# Altium footprint library User.PcbLib: 317 footprints (part 3 of 20)
Each footprint in its own frame and in the unit in brackets; x right, y up, seen from the top. Pads: shape width x height; smd on the part's side, far side on the other; paste and mask are expansions set on the pad; w line width, h text height; cw(c..) or ccw(c..) is an arc to the next point about the centre after c.
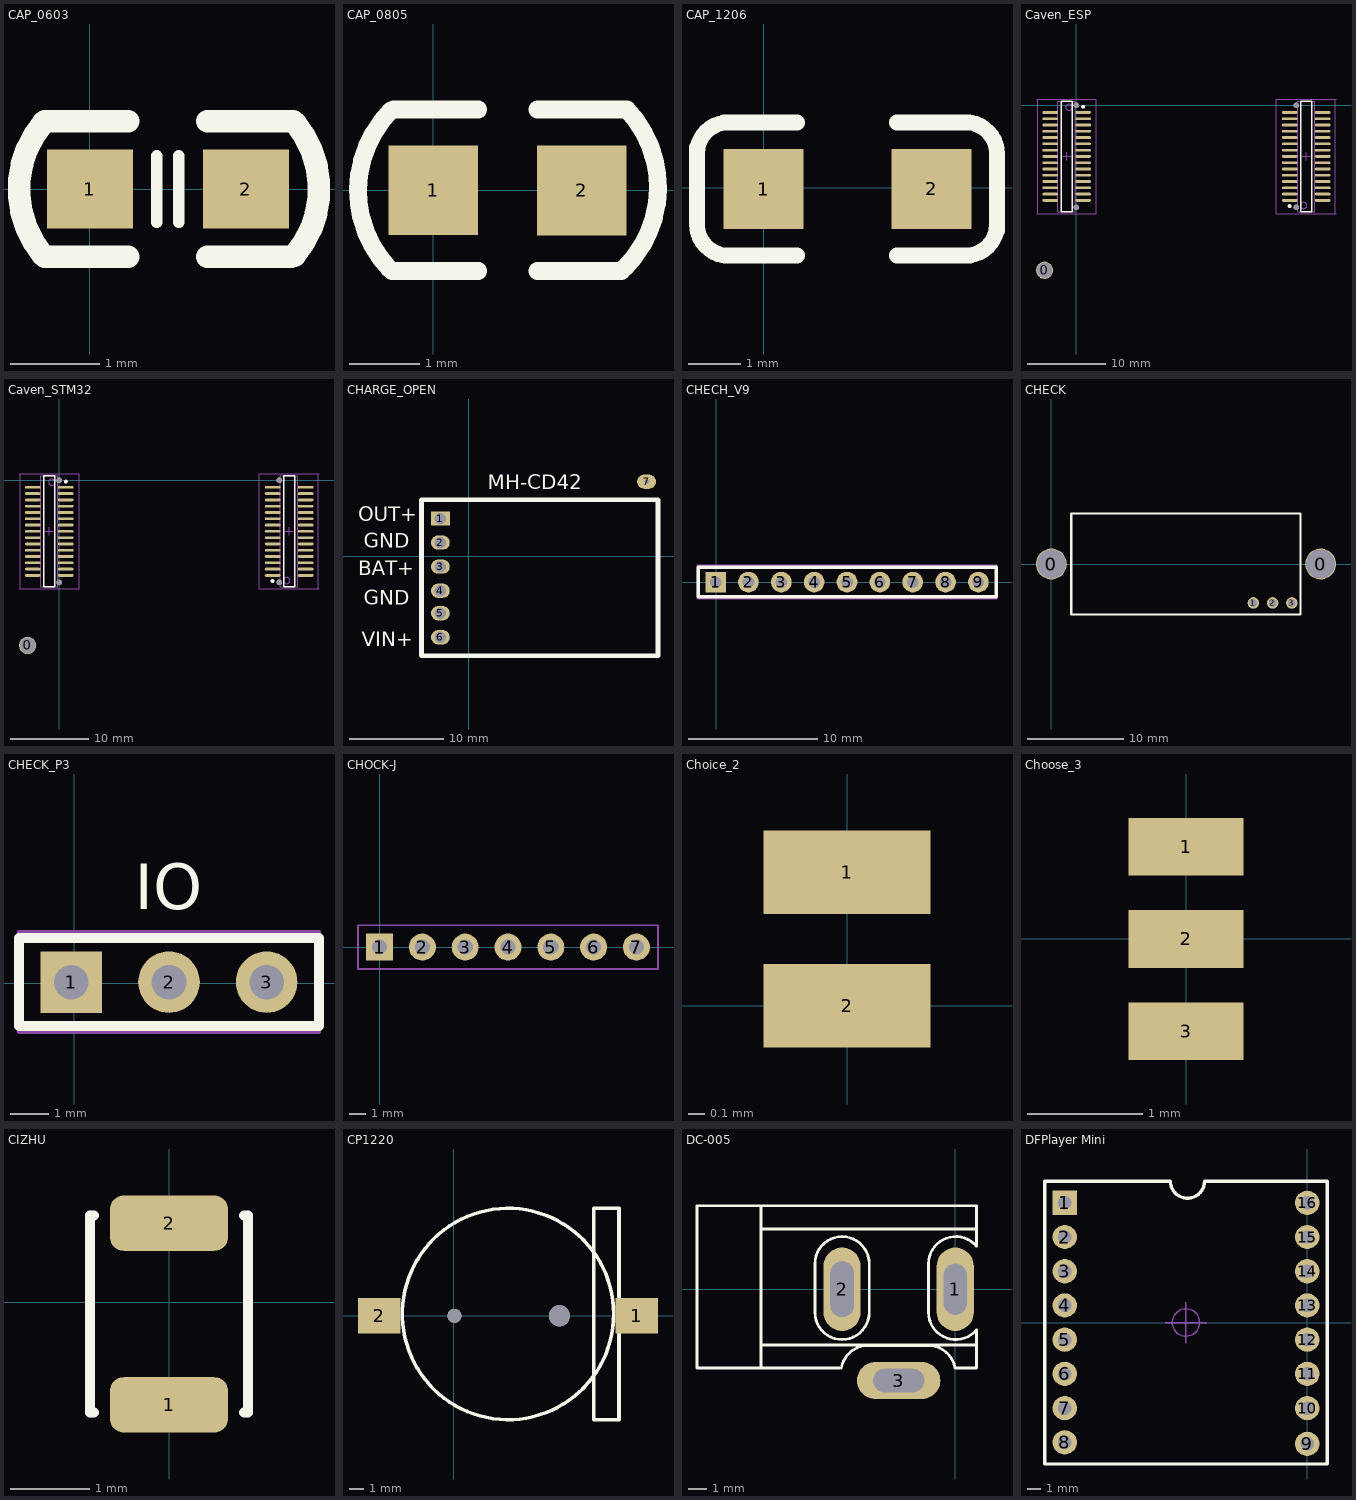
[diagram p2: the footprints below, top view; thin cyan lines are the x and y axes]

## CAP_0603 [mil]
pads (2):
  rect 38x35 smd: 1(0,0) 2(69,0)
Top Overlay:
  lines w5: 29.53,-14.83 29.53,14.7 ; 39.37,-14.83 39.37,14.7
  lines w10: -21,-29 cw(c14.45,-0.04) -20.48,29.56 ; -20,-30 17,-30 ; -20,30 17,30 ; 52,-30 89,-30 ; 52,30 90,30 ; 90.48,-29.56 ccw(c55.55,0.04) 91,29
3D body "User Library-0603 SMD Capacitor.STEP": height 11.89, standoff 0, extent 3.8,-15.8 66.8,15.7

## CAP_0805 [mm]
pads (2):
  rect 1.27x1.27 smd: 1(0,0) 2(2.101,-0.003)
Top Overlay:
  lines w0.254: -0.626,-1.109 cw(c0.539,-0.002) -0.602,1.13 ; -0.589,-1.143 0.635,-1.143 ; -0.566,1.143 0.635,1.143 ; 1.473,-1.143 2.667,-1.143 ; 1.473,1.143 2.72,1.143 ; 2.716,-1.093 ccw(c1.574,0.039) 2.743,1.143
3D body "User Library-0805 SMD Capacitor.STEP": height 0.77, standoff -0.01, extent 0.049,-0.622 2.049,0.628

## CAP_1206 [mil]
pads (2):
  rect 60x60 smd: 1(0,-1) 2(126,-1)
Top Overlay:
  lines w11.81: -50,-27 ccw(c-26.5,-27.5) -27,-51 ; -50,26 cw(c-26.5,25.5) -26,49 ; 151,-51 ccw(c151.5,-27.5) 175,-28 ; 152,49 cw(c151.5,25.5) 175,25
  lines w12: -50,-28 -50,30 ; -29,-51 25,-51 ; -28,49 25,49 ; 100,-51 153,-51 ; 100,49 154,49 ; 175,-32 175,26
3D body "Capacitor 1206 SMD1.step": height 39.45, standoff 0, extent 0.01,-32.49 126,30.5

## Caven_ESP [mm] "Caven_ESP"
pads (65):
  round 2.2 hole 2: 0(-4.051,-21)
  round 0.7 hole 0.7: 0(0,-13) 0(0,0) 0(28,-13) 0(28,0)
  oval 2x0.35 smd: 1(-3.35,-0.9) 2(-3.35,-1.7) 3(-3.35,-2.5) 4(-3.35,-3.3) 5(-3.35,-4.1) 6(-3.35,-4.9) 7(-3.35,-5.7) 8(-3.35,-6.5) 9(-3.35,-7.3) 10(-3.35,-8.1) 11(-3.35,-8.9) 12(-3.35,-9.7) 13(-3.35,-10.5) 14(-3.35,-11.3) 15(-3.35,-12.1) 16(0.85,-12.1) 17(0.85,-11.3) 18(0.85,-10.5) 19(0.85,-9.7) 20(0.85,-8.9) 21(0.85,-8.1) 22(0.85,-7.3) 23(0.85,-6.5) 24(0.85,-5.7) 25(0.85,-4.9) 26(0.85,-4.1) 27(0.85,-3.3) 28(0.85,-2.5) 29(0.85,-1.7) 30(0.85,-0.9) 31(27.15,-0.9) 32(27.15,-1.7) 33(27.15,-2.5) 34(27.15,-3.3) 35(27.15,-4.1) 36(27.15,-4.9) 37(27.15,-5.7) 38(27.15,-6.5) 39(27.15,-7.3) 40(27.15,-8.1) 41(27.15,-8.9) 42(27.15,-9.7) 43(27.15,-10.5) 44(27.15,-11.3) 45(27.15,-12.1) 46(31.35,-12.1) 47(31.35,-11.3) 48(31.35,-10.5) 49(31.35,-9.7) 50(31.35,-8.9) 51(31.35,-8.1) 52(31.35,-7.3) 53(31.35,-6.5) 54(31.35,-5.7) 55(31.35,-4.9) 56(31.35,-4.1) 57(31.35,-3.3) 58(31.35,-2.5) 59(31.35,-1.7) 60(31.35,-0.9)
Top Overlay:
  circle w0.25: c0.85,-0.175 r0.125
  circle w0.25: c27.15,-12.825 r0.125
  lines w0.2: -1.95,-13.55 -0.55,-13.55 -0.55,0.55 -1.95,0.55 -1.95,-13.55 ; 28.55,-13.55 28.55,0.55 29.95,0.55 29.95,-13.55 28.55,-13.55
Mechanical 13:
  circle w0.1: c-0.95,-0.25 r0.4
  circle w0.1: c28.95,-12.75 r0.4
  lines w0.1: -2.35,-13.55 -0.15,-13.55 -0.15,0.55 -2.35,0.55 -2.35,-13.55 ; 28.15,-13.55 28.15,0.55 30.35,0.55 30.35,-13.55 28.15,-13.55
Mechanical 15:
  lines w0.05: -5.05,-13.8 2.55,-13.8 2.55,0.8 -5.05,0.8 ; -4.95,-13.8 -4.95,0.8 ; 32.95,-13.8 32.95,0.8 ; 33.05,-13.8 25.45,-13.8 25.45,0.8 33.05,0.8
  lines w0.1: -1.75,-6.5 -0.75,-6.5 ; -1.25,-7 -1.25,-6 ; 28.75,-6.5 29.75,-6.5 ; 29.25,-7 29.25,-6
3D body "SG340-GxxS-B1-2x15.STEP": height 4, standoff -0.6, extent 26.75,-13.45 31.75,0.45
3D body "SG340-GxxS-B1-2x15.STEP": height 4, standoff -0.6, extent 26.75,-13.45 31.75,0.45
3D body "SG340-GxxS-B1-2x15.STEP": height 4, standoff -0.6, extent -3.75,-13.45 1.25,0.45
3D body "PCB.step": height 11.85, standoff 2.29, extent -6.02,-23.012 34.081,19.134

## Caven_STM32 [mm]
pads (65):
  round 2.2 hole 2: 0(-4,-21)
  round 0.7 hole 0.7: 0(0,-13) 0(0,0) 0(28,-13) 0(28,0)
  oval 2x0.35 smd: 1(-3.35,-0.9) 2(-3.35,-1.7) 3(-3.35,-2.5) 4(-3.35,-3.3) 5(-3.35,-4.1) 6(-3.35,-4.9) 7(-3.35,-5.7) 8(-3.35,-6.5) 9(-3.35,-7.3) 10(-3.35,-8.1) 11(-3.35,-8.9) 12(-3.35,-9.7) 13(-3.35,-10.5) 14(-3.35,-11.3) 15(-3.35,-12.1) 16(0.85,-12.1) 17(0.85,-11.3) 18(0.85,-10.5) 19(0.85,-9.7) 20(0.85,-8.9) 21(0.85,-8.1) 22(0.85,-7.3) 23(0.85,-6.5) 24(0.85,-5.7) 25(0.85,-4.9) 26(0.85,-4.1) 27(0.85,-3.3) 28(0.85,-2.5) 29(0.85,-1.7) 30(0.85,-0.9) 31(27.15,-0.9) 32(27.15,-1.7) 33(27.15,-2.5) 34(27.15,-3.3) 35(27.15,-4.1) 36(27.15,-4.9) 37(27.15,-5.7) 38(27.15,-6.5) 39(27.15,-7.3) 40(27.15,-8.1) 41(27.15,-8.9) 42(27.15,-9.7) 43(27.15,-10.5) 44(27.15,-11.3) 45(27.15,-12.1) 46(31.35,-12.1) 47(31.35,-11.3) 48(31.35,-10.5) 49(31.35,-9.7) 50(31.35,-8.9) 51(31.35,-8.1) 52(31.35,-7.3) 53(31.35,-6.5) 54(31.35,-5.7) 55(31.35,-4.9) 56(31.35,-4.1) 57(31.35,-3.3) 58(31.35,-2.5) 59(31.35,-1.7) 60(31.35,-0.9)
Top Overlay:
  circle w0.25: c27.15,-12.825 r0.125
  circle w0.25: c0.85,-0.175 r0.125
  lines w0.2: -1.95,-13.55 -1.95,0.55 -0.55,0.55 -0.55,-13.55 -1.95,-13.55 ; 28.55,-13.55 29.95,-13.55 29.95,0.55 28.55,0.55 28.55,-13.55
Mechanical 13:
  circle w0.1: c28.95,-12.75 r0.4
  circle w0.1: c-0.95,-0.25 r0.4
  lines w0.1: -2.35,-13.55 -2.35,0.55 -0.15,0.55 -0.15,-13.55 -2.35,-13.55 ; 28.15,-13.55 30.35,-13.55 30.35,0.55 28.15,0.55 28.15,-13.55
Mechanical 15:
  lines w0.05: -5.05,-13.8 2.55,-13.8 2.55,0.8 -5.05,0.8 ; -4.95,-13.8 -4.95,0.8 ; 32.95,-13.8 32.95,0.8 ; 33.05,-13.8 25.45,-13.8 25.45,0.8 33.05,0.8
  lines w0.1: -1.75,-6.5 -0.75,-6.5 ; -1.25,-7 -1.25,-6 ; 28.75,-6.5 29.75,-6.5 ; 29.25,-7 29.25,-6
3D body "SG340-GxxS-B1-2x15.STEP": height 4, standoff -0.6, extent -3.75,-13.45 1.25,0.45
3D body "SG340-GxxS-B1-2x15.STEP": height 4, standoff -0.6, extent 26.74,-13.454 31.74,0.446
3D body "Cavend.step": height 11.19, standoff 2.14, extent -6,-23 34.254,16.523

## CHARGE_OPEN [mm]
pads (7):
  rect 2x1.5 hole 1.2: 1(-3,4)
  oval 2x1.5 hole 1.2: 2(-3,1.46) 3(-3,-1.08) 4(-3,-3.62) 5(-3,-6) 6(-3,-8.54)
  oval 2x1.5 hole 0.5: 7(18.8,7.9)
Top Overlay:
  lines w0.5: -5,-10.5 -5,6 20,6 20,-10.5 -5,-10.5
  text "OUT+" at -11.7,3.7 h1.52
  text "VIN+" at -11.3,-9.5 h1.52
  text "GND" at -11.1,-5.1 h1.52
  text "GND" at -11.1,0.9 h1.52
  text "BAT+" at -11.7,-2 h1.52
  text "MH-CD42" at 2,7.1 h1.52
3D body: height 5, standoff 0.2, extent -5,-10.5 20,6

## CHECH_V9 [mm]
pads (9):
  rect 1.6x1.6 hole 0.9: 1(-0.05,0)
  round 1.6 hole 0.9: 2(2.49,0) 3(5.03,0) 4(7.57,0) 5(10.11,0) 6(12.65,0) 7(15.19,0) 8(17.73,0) 9(20.27,0)
Top Overlay:
  lines w0.254: -1.39,-1.143 21.65,-1.143 21.65,1.143 -1.39,1.143 -1.39,-1.143
Mechanical 15:
  lines w0.1: -1.49,-1.3 21.71,-1.3 21.71,1.3 -1.49,1.3 -1.49,-1.3
3D body "Header-F-2.54X9.stp": height 8.6, standoff -3.1, extent -1.445,-1.26 21.665,1.24

## CHECK [mm] "VEL-CHECK"
pads (5):
  round 3.2 hole 3: 0(0,0) 0(28,0)
  round 1.2 hole 0.8: 1(21.008,-4.05) 2(23.008,-4.05) 3(25.008,-4.05)
Top Overlay:
  lines w0.254: 2.083,-5.25 25.908,-5.25 25.908,5.25 2.083,5.25 2.083,-5.25
3D body "M3x9.STEP": height 9.05, standoff 0.05, extent 25.302,-2.35 30.698,2.35
3D body "M3x9.STEP": height 9.05, standoff 0.05, extent -2.698,-2.35 2.698,2.35
3D body "SMG 0.28-3P.STEP": height 18, standoff 8.4, extent 2.731,-5.051 25.261,4.949
3D body "HDR2.0-LI-3P.STEP": height 1.5, standoff -7.8, extent 20.008,-5.05 26.008,-3.05

## CHECK_P3 [mm]
pads (3):
  rect 1.6x1.6 hole 0.9: 1(-0.076,0.025)
  round 1.6 hole 0.9: 2(2.464,0.025) 3(5.004,0.025)
Top Overlay:
  lines w0.254: -1.436,-1.118 -1.436,1.168 6.364,1.168 6.364,-1.118 -1.436,-1.118
  text "IO" at 1.577,1.534 h2.03
Mechanical 15:
  lines w0.1: -1.436,-1.275 -1.436,1.325 6.364,1.325 6.364,-1.275 -1.436,-1.275
3D body "Header-F-2.54X3.stp": height 8.6, standoff -3.1, extent -1.471,-1.235 6.399,1.265

## CHOCK-J [mm]
pads (7):
  rect 1.6x1.6 hole 0.9: 1(0,0)
  round 1.6 hole 0.9: 2(2.54,0) 3(5.08,0) 4(7.62,0) 5(10.16,0) 6(12.7,0) 7(15.24,0)
Bottom Overlay:
  lines w0.254: 14.783,2.261 15.799,2.261 ; -1.143,-1.143 -1.143,1.143 16.42,1.143 16.42,-1.143 -1.143,-1.143
  text "+" at 0.506,1.675 h2.54
  text "1" at 2.921,1.778 h2.03
Mechanical 15:
  lines w0.1: -1.28,-1.3 -1.28,1.3 16.52,1.3 16.52,-1.3 -1.28,-1.3
3D body "HEADER 7H.STEP": height 4.43, standoff -2.9, extent -1.26,-6.97 16.52,1.3

## Choice_2 [mm]
pads (2):
  rect 1x0.5 smd: 1(0,0.8) 2(0,0)

## Choose_3 [mm]
pads (3):
  rect 1x0.5 smd: 1(0,0.8) 2(0,0) 3(0,-0.8)

## CIZHU [mm]
pads (2):
  rrect50% 1.5x0.7 smd: 1(0,-1.3) 2(0,1)
Top Overlay:
  lines w0.127: -0.95,-1.4 -1,-1.4 -1,1.1 -0.95,1.1 ; 0.95,-1.4 1,-1.4 1,1.1 0.95,1.1
Mechanical 1:
  lines w0.127: -1,-1.4 -1,1.1 ; 1,-1.4 1,1.1
3D body "User Library-Chip InductorINDC2012X95N.STEP": height 0.92, standoff -0.03, extent -0.6,-1.15 0.6,0.85

## CP1220 [mm]
pads (4):
  rect 3x2.5 smd: 1(12.988,0) 2(-5.3,0)
  round 1 hole 1: ""(0.038,0)
  round 1.5 hole 1.5: ""(7.488,0)
Top Overlay:
  circle w0.254: c3.844,0.128 r7.5
  lines w0.254: 9.94,-7.366 11.718,-7.366 11.718,7.62 9.94,7.62 9.94,-7.366
3D body "cr1220smd.STEP": height 4.94, standoff 0, extent -5.096,-7.519 13.404,7.477

## DC-005 [mil]
pads (3):
  oval 80x180 hole 50 slot 110 at 90 deg: 1(0,0)
  oval 80x180 hole 50 slot 120 at 90 deg: 2(-244.09,0)
  oval 180x80 hole 50 slot 110 at 0 deg: 3(-122.05,-196.85)
Top Overlay:
  lines w6: -419.09,-120 45.91,-120 ; -419.09,130 41.04,130 45.15,130 ; -414.09,180 -434.09,180 -556.89,180 -556.89,-170 -419.09,-170 ; -250.09,-170 -419.09,-170 ; -245.73,-169.84 cw(c-188.09,-180) -188.09,-121.48 -58.09,-121.48 cw(c-58.09,-180) -0.46,-169.84 ; 0.91,-170 45.91,-170 45.91,-90 ; 45.74,-87.62 cw(c0.91,-50) -57.62,-50 -57.62,55 cw(c0.91,55) 45.74,92.62 45.91,180 -419.09,180 -419.09,-170 ; -185.57,55 ccw(c-244.09,55) -302.62,55 -302.62,-50 ccw(c-244.09,-50) -185.57,-50 -185.57,55 ; -185.57,55 -185.57,55
3D body "dc-005.STEP": height 440.94, standoff -149.61, extent -550.09,-188.07 3.06,178.07

## DFPlayer Mini [mm] "长：21mm ， 宽： 21mm，高：6mm"
pads (16):
  rect 1.8x1.8 hole 1: 1(-18,8.89)
  round 1.8 hole 1: 2(-18,6.35) 3(-18,3.81) 4(-18,1.27) 5(-18,-1.27) 6(-18,-3.81) 7(-18,-6.35) 8(-18,-8.89) 9(0,-9) 10(0,-6.35) 11(0,-3.81) 12(0,-1.27) 13(0,1.27) 14(0,3.81) 15(0,6.35) 16(0,8.89)
Top Overlay:
  lines w0.25: -10.16,10.5 ccw(c-8.89,10.5) -7.62,10.5
  lines w0.254: -10.16,10.5 -19.5,10.5 -19.5,-10.5 1.5,-10.5 1.5,10.5 -7.62,10.5
Mechanical 15:
  circle w0.1: c-9,0 r1.016
  lines w0.1: -10.524,0 -7.476,0 ; -9,-1.524 -9,1.524
3D body "DFPlayer Mini.STEP": height 6.02, standoff -6, extent -19.5,-10.5 1.5,10.5